# Altium footprint library microbuilder.PCBLIB: 422 footprints (part 1 of 27)
Each footprint in its own frame and in the unit in brackets; x right, y up, seen from the top. Pads: shape width x height; smd on the part's side, far side on the other; paste and mask are expansions set on the pad; w line width, h text height; cw(c..) or ccw(c..) is an arc to the next point about the centre after c.
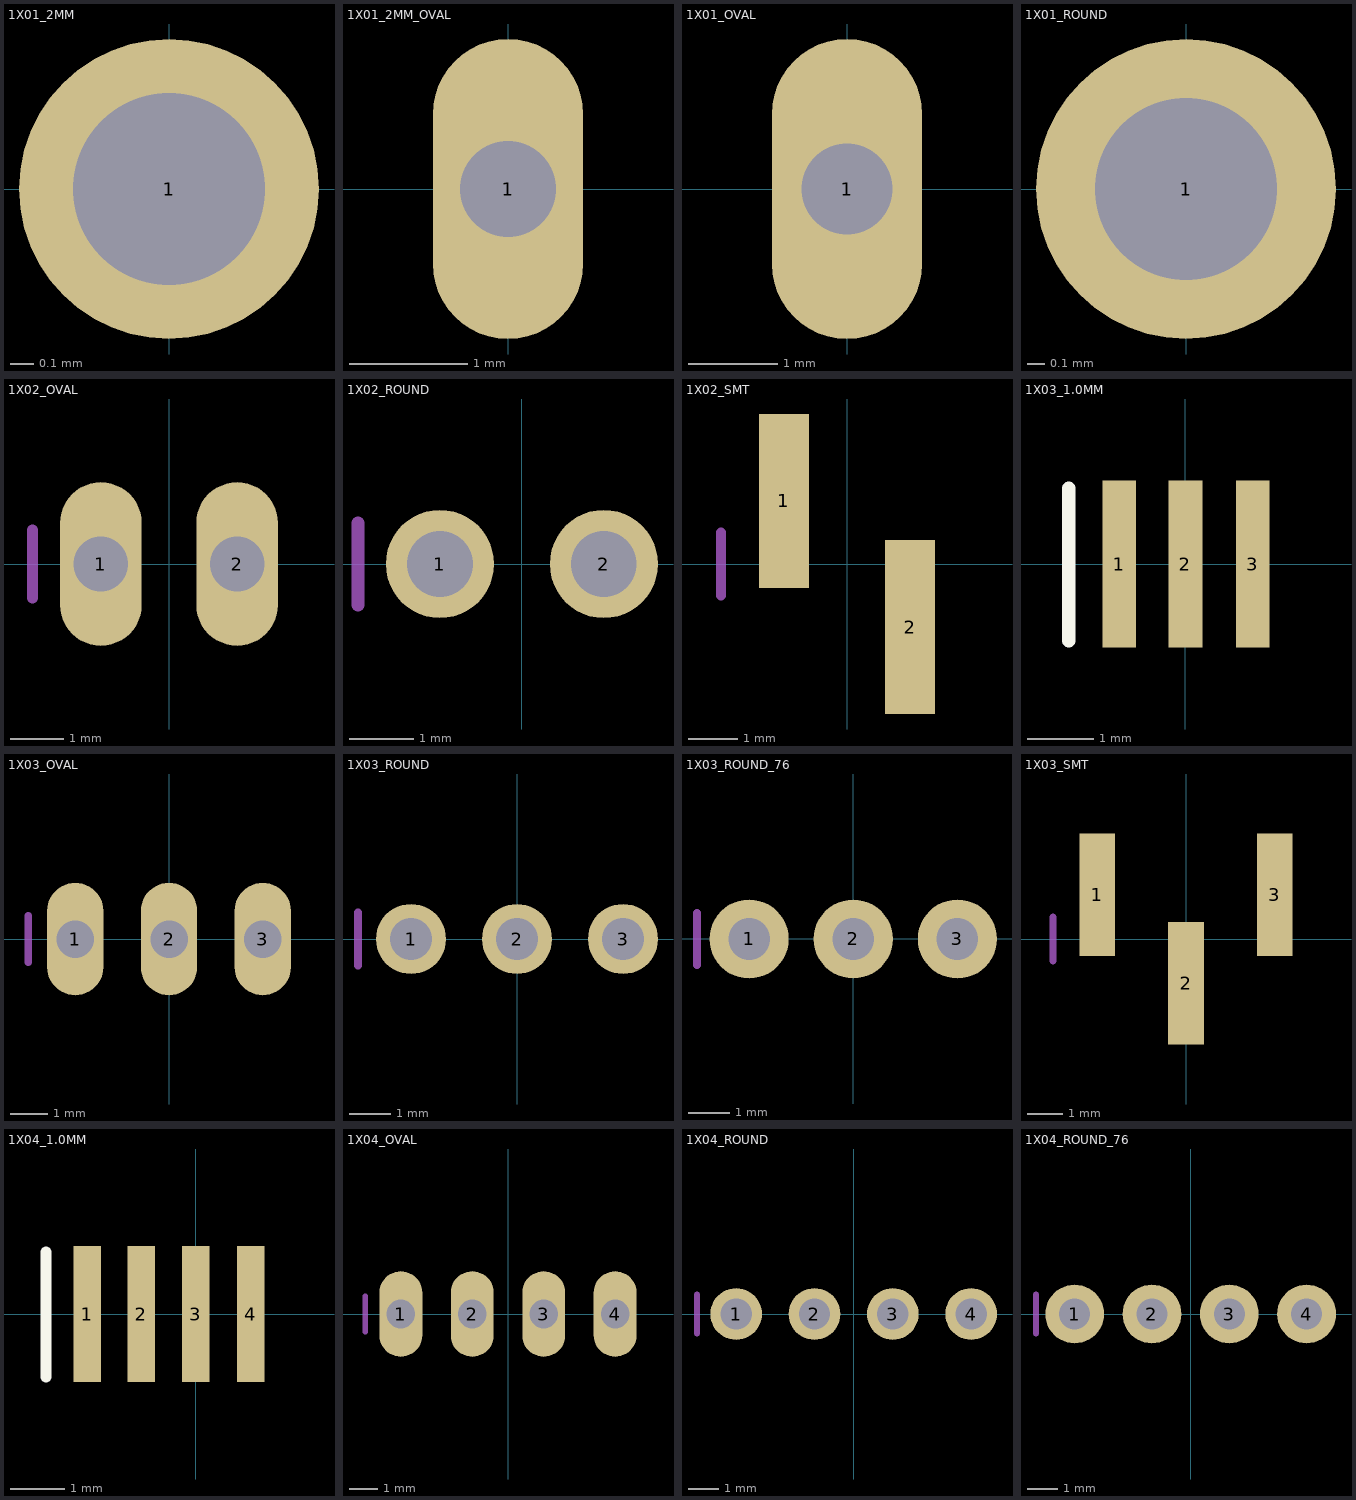
[diagram p0: the footprints below, top view; thin cyan lines are the x and y axes]

## 1X01_2MM [mil]
pads (1):
  round 50 hole 32: 1(0,0)
Mechanical 16:
  rectangle: -10,-10 10,10

## 1X01_2MM_OVAL [mil]
pads (1):
  oval 50x100 hole 32: 1(0,0)
Mechanical 16:
  rectangle: -10,-10 10,10

## 1X01_OVAL [mil]
pads (1):
  oval 66x132 hole 40: 1(0,0)
Mechanical 16:
  rectangle: -10,-10 10,10

## 1X01_ROUND [mil]
pads (1):
  round 66 hole 40: 1(0,0)
Mechanical 16:
  rectangle: -10,-10 10,10

## 1X02_OVAL [mil]
pads (2):
  oval 60x120 hole 40: 1(-50,0) 2(50,0)
Mechanical 16:
  rectangle: -60,-10 -40,10
  rectangle: 40,-10 60,10
  lines w8: -100,-25 -100,25

## 1X02_ROUND [mil]
pads (2):
  round 66 hole 40: 1(-50,0) 2(50,0)
Mechanical 16:
  rectangle: -60,-10 -40,10
  rectangle: 40,-10 60,10
  lines w8: -100,-25 -100,25

## 1X02_SMT [mil]
pads (2):
  rect 40x138 smd: 1(-50,50) 2(50,-50)
Mechanical 16:
  lines w8: -100,-25 -100,25

## 1X03_1.0MM [mil]
pads (3):
  rect 20x99 smd: 1(-39.37,0) 2(0,0) 3(40,0)
Top Overlay:
  lines w8: -69.37,-45.63 -69.37,45

## 1X03_OVAL [mil]
pads (3):
  oval 60x120 hole 40: 1(-100,0) 2(0,0) 3(100,0)
Mechanical 16:
  rectangle: -10,-10 10,10
  rectangle: -110,-10 -90,10
  rectangle: 90,-10 110,10
  lines w8: -150,-25 -150,25

## 1X03_ROUND [mil]
pads (3):
  round 66 hole 40: 1(-100,0) 2(0,0) 3(100,0)
Mechanical 16:
  rectangle: -10,-10 10,10
  rectangle: -110,-10 -90,10
  rectangle: 90,-10 110,10
  lines w8: -150,-25 -150,25

## 1X03_ROUND_76 [mil]
pads (3):
  round 76 hole 40: 1(-100,0) 2(0,0) 3(100,0)
Mechanical 16:
  rectangle: -10,-10 10,10
  rectangle: -110,-10 -90,10
  rectangle: 90,-10 110,10
  lines w8: -150,-25 -150,25

## 1X03_SMT [mil]
pads (3):
  rect 40x138 smd: 1(-100,50) 2(0,-50) 3(100,50)
Mechanical 16:
  lines w8: -150,-25 -150,25

## 1X04_1.0MM [mil]
pads (4):
  rect 20x99 smd: 1(-78.74,0) 2(-39.37,0) 3(0,0) 4(40,0)
Top Overlay:
  lines w8: -108.74,-45.63 -108.74,45

## 1X04_OVAL [mil]
pads (4):
  oval 60x120 hole 40: 1(-150,0) 2(-50,0) 3(50,0) 4(150,0)
Mechanical 16:
  rectangle: 40,-10 60,10
  rectangle: -60,-10 -40,10
  rectangle: -160,-10 -140,10
  rectangle: 140,-10 160,10
  lines w8: -200,-25 -200,25

## 1X04_ROUND [mil]
pads (4):
  round 66 hole 40: 1(-150,0) 2(-50,0) 3(50,0) 4(150,0)
Mechanical 16:
  rectangle: 40,-10 60,10
  rectangle: -60,-10 -40,10
  rectangle: -160,-10 -140,10
  rectangle: 140,-10 160,10
  lines w8: -200,-25 -200,25

## 1X04_ROUND_76 [mil]
pads (4):
  round 76 hole 40: 1(-150,0) 2(-50,0) 3(50,0) 4(150,0)
Mechanical 16:
  rectangle: 40,-10 60,10
  rectangle: -60,-10 -40,10
  rectangle: -160,-10 -140,10
  rectangle: 140,-10 160,10
  lines w8: -200,-25 -200,25